# Altium footprint library ALL.PcbLib: 153 footprints (part 4 of 11)
Each footprint in its own frame and in the unit in brackets; x right, y up, seen from the top. Pads: shape width x height; smd on the part's side, far side on the other; paste and mask are expansions set on the pad; w line width, h text height; cw(c..) or ccw(c..) is an arc to the next point about the centre after c.
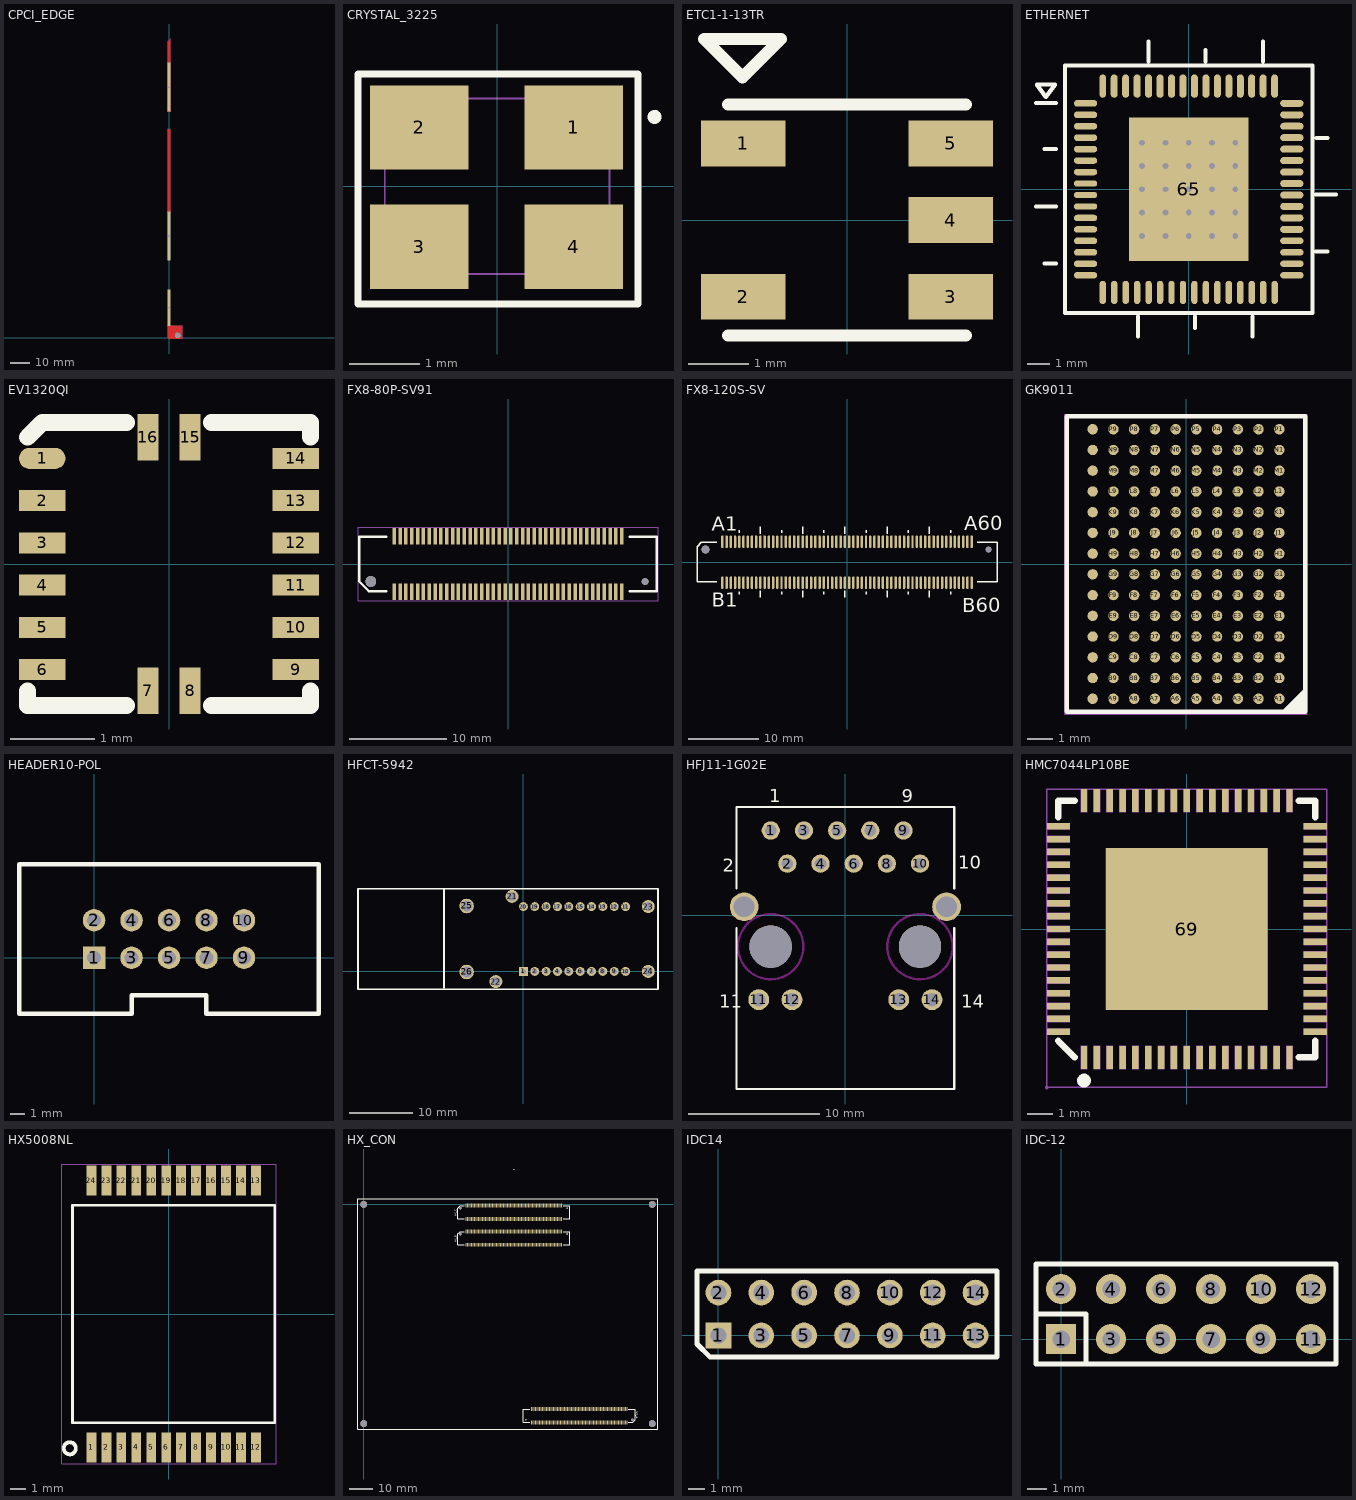
[diagram p3: the footprints below, top view; thin cyan lines are the x and y axes]

## CPCI_EDGE [mil]
pads (4):
  rect 60x1000 / inner round 60 / far side rect 60x1000 hole 35: 1(-10,5100) 2(-10,2070)
  rect 60x740 / inner round 60 / far side rect 60x740 hole 35: 3(-10,610)
  round 100 hole 106: 4(170,50)
Top Layer:
  region: -40,250 -40,10 -5,-25 260,-25 260,240 20,240 20,250
  region: -40,2540 -40,4240 20,4240 20,2540
  region: -40,6020 20,6080 20,4600 -40,4600
  region: -40,5560 -40,6020 20,6020 20,5560
Bottom Layer:
  region: -40,261 -40,11 -5,-24 260,-24 260,241 20,241 20,261
  region: -40,1590 -40,4250 20,4250 20,1590
  region: -40,6020 20,6080 20,4600 -40,4600
  region: -40,6020 -40,4600 20,4600 20,6020

## CRYSTAL_3225 [mil] "CRYSTAL_3225"
pads (4):
  rect 55.12x47.24 smd: 1(43,33.01) 2(-43.62,33.01) 3(-43.62,-33.92) 4(43,-33.92)
Top Overlay:
  circle w3.94: c88.27,38.91 r1.97
  lines w3.94: -78,-65.99 79,-65.99 79,63.01 -78,63.01 -78,-65.99
  text ".Designator" at -69.88,111.01 h30
Mechanical 7:
  lines w1: -63,-49.21 62.99,-49.21 62.99,49.21 -63,49.21 -63,-49.21

## ETC1-1-13TR [mm]
pads (5):
  rect 1.4x0.76 smd: 1(-1.715,1.27) 2(-1.715,-1.27) 3(1.715,-1.27) 4(1.715,0) 5(1.715,1.27)
Top Overlay:
  lines w0.2: -1.97,-1.915 1.97,-1.915 ; -1.97,1.915 1.97,1.915 ; -2.365,3 -1.095,3 -1.73,2.365 -2.365,3

## ETHERNET [mm]
height 1.1
pads (65):
  oval 1.016x0.279 smd: 1(-4.5,3.75) 2(-4.5,3.25) 3(-4.5,2.75) 4(-4.5,2.25) 5(-4.5,1.75) 6(-4.5,1.25) 7(-4.5,0.75) 8(-4.5,0.25) 9(-4.5,-0.25) 10(-4.5,-0.75) 11(-4.5,-1.25) 12(-4.5,-1.75) 13(-4.5,-2.25) 14(-4.5,-2.75) 15(-4.5,-3.25) 16(-4.5,-3.75) 33(4.5,-3.75) 34(4.5,-3.25) 35(4.5,-2.75) 36(4.5,-2.25)
  oval 0.279x1.016 smd: 17(-3.75,-4.5) 18(-3.25,-4.5) 19(-2.75,-4.5) 20(-2.25,-4.5) 21(-1.75,-4.5) 22(-1.25,-4.5) 23(-0.75,-4.5) 24(-0.25,-4.5) 25(0.25,-4.5) 26(0.75,-4.5) 27(1.25,-4.5) 28(1.75,-4.5) 29(2.25,-4.5) 30(2.75,-4.5) 31(3.25,-4.5) 32(3.75,-4.5) 64(-3.75,4.5)
  oval 1.016x0.305 smd: 37(4.5,-1.75) 38(4.5,-1.25) 39(4.5,-0.75) 40(4.5,-0.25) 41(4.5,0.25) 42(4.5,0.75) 43(4.5,1.25) 44(4.5,1.75) 45(4.5,2.25) 46(4.5,2.75) 47(4.5,3.25) 48(4.5,3.75)
  oval 0.305x1.016 smd: 49(3.75,4.5) 50(3.25,4.5) 51(2.75,4.5) 52(2.25,4.5) 53(1.75,4.5) 54(1.25,4.5) 55(0.75,4.5) 56(0.25,4.5) 57(-0.25,4.5) 58(-0.75,4.5) 59(-1.25,4.5) 60(-1.75,4.5) 61(-2.25,4.5) 62(-2.75,4.5) 63(-3.25,4.5)
  rect 5.21x6.25 smd: 65(0,0)
via 0,0 diameter 0.457 hole 0.254
via 0,1.016 diameter 0.457 hole 0.254
via 0,2.032 diameter 0.457 hole 0.254
via 0,-1.016 diameter 0.457 hole 0.254
via 0,-2.032 diameter 0.457 hole 0.254
via -1.016,0 diameter 0.457 hole 0.254
via -2.032,0 diameter 0.457 hole 0.254
via 1.016,0 diameter 0.457 hole 0.254
via 2.032,0 diameter 0.457 hole 0.254
via 1.016,1.016 diameter 0.457 hole 0.254
via 1.016,2.032 diameter 0.457 hole 0.254
via 1.016,-1.016 diameter 0.457 hole 0.254
via 1.016,-2.032 diameter 0.457 hole 0.254
via 2.032,1.016 diameter 0.457 hole 0.254
via 2.032,2.032 diameter 0.457 hole 0.254
via 2.032,-1.016 diameter 0.457 hole 0.254
via 2.032,-2.032 diameter 0.457 hole 0.254
via -1.016,1.016 diameter 0.457 hole 0.254
via -1.016,2.032 diameter 0.457 hole 0.254
via -1.016,-1.016 diameter 0.457 hole 0.254
via -1.016,-2.032 diameter 0.457 hole 0.254
via -2.032,1.016 diameter 0.457 hole 0.254
via -2.032,2.032 diameter 0.457 hole 0.254
via -2.032,-1.016 diameter 0.457 hole 0.254
via -2.032,-2.032 diameter 0.457 hole 0.254
Top Overlay:
  lines w0.178: -6.662,-0.743 -5.798,-0.743 ; -6.662,3.757 -5.798,3.757 ; -6.292,-3.243 -5.798,-3.243 ; -6.292,1.757 -5.798,1.757 ; -2.217,-6.414 -2.217,-5.551 ; -1.76,5.575 -1.76,6.438 ; 0.283,-6.044 0.283,-5.551 ; 0.74,5.575 0.74,6.068 ; 2.783,-6.414 2.783,-5.551 ; 3.24,5.575 3.24,6.438 ; 5.563,-2.718 6.056,-2.718 ; 5.563,-0.229 6.426,-0.229 ; 5.566,2.243 6.06,2.243 ; -6.625,4.571 -5.825,4.571 -6.233,4.025 -6.625,4.571 ; -5.4,-5.4 -5.4,5.4 5.4,5.4 5.4,-5.4 -5.4,-5.4

## EV1320QI [mm]
pads (16):
  oval 0.55x0.25 smd: 1(-1.5,1.25)
  rect 0.55x0.25 smd: 2(-1.5,0.75) 3(-1.5,0.25) 4(-1.5,-0.25) 5(-1.5,-0.75) 6(-1.5,-1.25) 9(1.5,-1.25) 10(1.5,-0.75) 11(1.5,-0.25) 12(1.5,0.25) 13(1.5,0.75) 14(1.5,1.25)
  rect 0.25x0.55 smd: 7(-0.25,-1.5) 8(0.25,-1.5) 15(0.25,1.5) 16(-0.25,1.5)
Top Overlay:
  lines w0.2: -1.675,-1.5 -1.675,-1.675 -0.5,-1.675 ; -1.675,1.5 -1.5,1.675 -0.5,1.675 ; 0.5,-1.675 1.675,-1.675 1.675,-1.5 ; 0.5,1.675 1.675,1.675 1.675,1.5

## FX8-80P-SV91 [mm] "FX8-80P-SV91"
pads (82):
  rect 0.35x1.7 smd: A1_1(-11.7,-2.85) A1_2(-11.1,-2.85) A1_3(-10.5,-2.85) A1_4(-9.9,-2.85) A1_5(-9.3,-2.85) A1_6(-8.7,-2.85) A1_7(-8.1,-2.85) A1_8(-7.5,-2.85) A1_9(-6.9,-2.85) A1_10(-6.3,-2.85) A1_11(-5.7,-2.85) A1_12(-5.1,-2.85) A1_13(-4.5,-2.85) A1_14(-3.9,-2.85) A1_15(-3.3,-2.85) A1_16(-2.7,-2.85) A1_17(-2.1,-2.85) A1_18(-1.5,-2.85) A1_19(-0.9,-2.85) A1_20(-0.3,-2.85) A1_21(0.3,-2.85) A1_22(0.9,-2.85) A1_23(1.5,-2.85) A1_24(2.1,-2.85) A1_25(2.7,-2.85) A1_26(3.3,-2.85) A1_27(3.9,-2.85) A1_28(4.5,-2.85) A1_29(5.1,-2.85) A1_30(5.7,-2.85) A1_31(6.3,-2.85) A1_32(6.9,-2.85) A1_33(7.5,-2.85) A1_34(8.1,-2.85) A1_35(8.7,-2.85) A1_36(9.3,-2.85) A1_37(9.9,-2.85) A1_38(10.5,-2.85) A1_39(11.1,-2.85) A1_40(11.7,-2.85) B1_1(-11.7,2.85) B1_2(-11.1,2.85) B1_3(-10.5,2.85) B1_4(-9.9,2.85) B1_5(-9.3,2.85) B1_6(-8.7,2.85) B1_7(-8.1,2.85) B1_8(-7.5,2.85) B1_9(-6.9,2.85) B1_10(-6.3,2.85) B1_11(-5.7,2.85) B1_12(-5.1,2.85) B1_13(-4.5,2.85) B1_14(-3.9,2.85) B1_15(-3.3,2.85) B1_16(-2.7,2.85) B1_17(-2.1,2.85) B1_18(-1.5,2.85) B1_19(-0.9,2.85) B1_20(-0.3,2.85) B1_21(0.3,2.85) B1_22(0.9,2.85) B1_23(1.5,2.85) B1_24(2.1,2.85) B1_25(2.7,2.85) B1_26(3.3,2.85) B1_27(3.9,2.85) B1_28(4.5,2.85) B1_29(5.1,2.85) B1_30(5.7,2.85) B1_31(6.3,2.85) B1_32(6.9,2.85) B1_33(7.5,2.85) B1_34(8.1,2.85) B1_35(8.7,2.85) B1_36(9.3,2.85) B1_37(9.9,2.85) B1_38(10.5,2.85) B1_39(11.1,2.85) B1_40(11.7,2.85)
  round 1.1 hole 1.1: ZH-C1(-14.1,-1.8)
  round 0.7 hole 0.7: ZH-C2(14.1,-1.8)
Top Overlay:
  lines w0.254: -12.5,-2.8 -14.3,-2.8 -15.3,-1.8 -15.3,2.8 -12.5,2.8 ; 12.5,-2.8 15.3,-2.8 15.3,2.8 12.5,2.8
  text ".Designator" at -0.709,-5.085 h0.76
Mechanical 7:
  lines w0.025: -15.427,-3.802 15.427,-3.802 15.427,3.802 -15.427,3.802 -15.427,-3.802

## FX8-120S-SV [mm]
pads (122):
  oval 0.35x1.8 smd mask+0.102: A1(-17.7,2.9) A2(-17.1,2.9) A3(-16.5,2.9) A4(-15.9,2.9) A5(-15.3,2.9) A6(-14.7,2.9) A7(-14.1,2.9) A8(-13.5,2.9) A9(-12.9,2.9) A10(-12.3,2.9) A11(-11.7,2.9) A12(-11.1,2.9) A13(-10.5,2.9) A14(-9.9,2.9) A15(-9.3,2.9) A16(-8.7,2.9) A17(-8.1,2.9) A18(-7.5,2.9) A19(-6.9,2.9) A20(-6.3,2.9) A21(-5.7,2.9) A22(-5.1,2.9) A23(-4.5,2.9) A24(-3.9,2.9) A25(-3.3,2.9) A26(-2.7,2.9) A27(-2.1,2.9) A28(-1.5,2.9) A29(-0.9,2.9) A30(-0.3,2.9) A31(0.3,2.9) A32(0.9,2.9) A33(1.5,2.9) A34(2.1,2.9) A35(2.7,2.9) A36(3.3,2.9) A37(3.9,2.9) A38(4.5,2.9) A39(5.1,2.9) A40(5.7,2.9) A41(6.3,2.9) A42(6.9,2.9) A43(7.5,2.9) A44(8.1,2.9) A45(8.7,2.9) A46(9.3,2.9) A47(9.9,2.9) A48(10.5,2.9) A49(11.1,2.9) A50(11.7,2.9) A51(12.3,2.9) A52(12.9,2.9) A53(13.5,2.9) A54(14.1,2.9) A55(14.7,2.9) A56(15.3,2.9) A57(15.9,2.9) A58(16.5,2.9) A59(17.1,2.9) A60(17.7,2.9) B1(-17.7,-2.9) B2(-17.1,-2.9) B3(-16.5,-2.9) B4(-15.9,-2.9) B5(-15.3,-2.9) B6(-14.7,-2.9) B7(-14.1,-2.9) B8(-13.5,-2.9) B9(-12.9,-2.9) B10(-12.3,-2.9) B11(-11.7,-2.9) B12(-11.1,-2.9) B13(-10.5,-2.9) B14(-9.9,-2.9) B15(-9.3,-2.9) B16(-8.7,-2.9) B17(-8.1,-2.9) B18(-7.5,-2.9) B19(-6.9,-2.9) B20(-6.3,-2.9) B21(-5.7,-2.9) B22(-5.1,-2.9) B23(-4.5,-2.9) B24(-3.9,-2.9) B25(-3.3,-2.9) B26(-2.7,-2.9) B27(-2.1,-2.9) B28(-1.5,-2.9) B29(-0.9,-2.9) B30(-0.3,-2.9) B31(0.3,-2.9) B32(0.9,-2.9) B33(1.5,-2.9) B34(2.1,-2.9) B35(2.7,-2.9) B36(3.3,-2.9) B37(3.9,-2.9) B38(4.5,-2.9) B39(5.1,-2.9) B40(5.7,-2.9) B41(6.3,-2.9) B42(6.9,-2.9) B43(7.5,-2.9) B44(8.1,-2.9) B45(8.7,-2.9) B46(9.3,-2.9) B47(9.9,-2.9) B48(10.5,-2.9) B49(11.1,-2.9) B50(11.7,-2.9) B51(12.3,-2.9) B52(12.9,-2.9) B53(13.5,-2.9) B54(14.1,-2.9) B55(14.7,-2.9) B56(15.3,-2.9) B57(15.9,-2.9) B58(16.5,-2.9) B59(17.1,-2.9) B60(17.7,-2.9)
  round 1.1 hole 1.1 unplated mask+0.102: ""(-20.1,1.8)
  round 0.8 hole 0.8 unplated mask+0.102: ""(20.1,1.8)
Top Overlay:
  lines w0.178: -18.5,-2.8 -21.3,-2.8 -21.3,2.195 -20.695,2.8 -18.5,2.8 ; -15.291,-4.547 -15.291,-4.166 ; -15.291,4.166 -15.291,4.547 ; -12.319,-5.004 -12.319,-4.064 ; -12.319,4.064 -12.319,5.004 ; -9.291,-4.547 -9.291,-4.166 ; -9.291,4.166 -9.291,4.547 ; -6.319,-5.004 -6.319,-4.064 ; -6.319,4.064 -6.319,5.004 ; -3.291,-4.547 -3.291,-4.166 ; -3.291,4.166 -3.291,4.547 ; -0.319,-5.004 -0.319,-4.064 ; -0.319,4.064 -0.319,5.004 ; 2.709,-4.547 2.709,-4.166 ; 2.709,4.166 2.709,4.547 ; 5.681,-5.004 5.681,-4.064 ; 5.681,4.064 5.681,5.004 ; 8.709,-4.547 8.709,-4.166 ; 8.709,4.166 8.709,4.547 ; 11.681,-5.004 11.681,-4.064 ; 11.681,4.064 11.681,5.004 ; 14.709,-4.547 14.709,-4.166 ; 14.709,4.166 14.709,4.547 ; 18.5,-2.8 21.3,-2.8 21.3,2.8 18.5,2.8
  text "A1" at -19.177,4.445 h2.03
  text "B1" at -19.177,-6.35 h2.03
  text "A60" at 16.637,4.572 h2.03
  text "B60" at 16.383,-7.112 h2.03

## GK9011 [mm] "GK9011"
pads (140):
  round 0.4 smd: A1(3.6,-5.2) A2(2.8,-5.2) A3(2,-5.2) A4(1.2,-5.2) A5(0.4,-5.2) A6(-0.4,-5.2) A7(-1.2,-5.2) A8(-2,-5.2) A9(-2.8,-5.2) A10(-3.6,-5.2) B1(3.6,-4.4) B2(2.8,-4.4) B3(2,-4.4) B4(1.2,-4.4) B5(0.4,-4.4) B6(-0.4,-4.4) B7(-1.2,-4.4) B8(-2,-4.4) B9(-2.8,-4.4) B10(-3.6,-4.4) C1(3.6,-3.6) C2(2.8,-3.6) C3(2,-3.6) C4(1.2,-3.6) C5(0.4,-3.6) C6(-0.4,-3.6) C7(-1.2,-3.6) C8(-2,-3.6) C9(-2.8,-3.6) C10(-3.6,-3.6) D1(3.6,-2.8) D2(2.8,-2.8) D3(2,-2.8) D4(1.2,-2.8) D5(0.4,-2.8) D6(-0.4,-2.8) D7(-1.2,-2.8) D8(-2,-2.8) D9(-2.8,-2.8) D10(-3.6,-2.8) E1(3.6,-2) E2(2.8,-2) E3(2,-2) E4(1.2,-2) E5(0.4,-2) E6(-0.4,-2) E7(-1.2,-2) E8(-2,-2) E9(-2.8,-2) E10(-3.6,-2) F1(3.6,-1.2) F2(2.8,-1.2) F3(2,-1.2) F4(1.2,-1.2) F5(0.4,-1.2) F6(-0.4,-1.2) F7(-1.2,-1.2) F8(-2,-1.2) F9(-2.8,-1.2) F10(-3.6,-1.2) G1(3.6,-0.4) G2(2.8,-0.4) G3(2,-0.4) G4(1.2,-0.4) G5(0.4,-0.4) G6(-0.4,-0.4) G7(-1.2,-0.4) G8(-2,-0.4) G9(-2.8,-0.4) G10(-3.6,-0.4) H1(3.6,0.4) H2(2.8,0.4) H3(2,0.4) H4(1.2,0.4) H5(0.4,0.4) H6(-0.4,0.4) H7(-1.2,0.4) H8(-2,0.4) H9(-2.8,0.4) H10(-3.6,0.4) J1(3.6,1.2) J2(2.8,1.2) J3(2,1.2) J4(1.2,1.2) J5(0.4,1.2) J6(-0.4,1.2) J7(-1.2,1.2) J8(-2,1.2) J9(-2.8,1.2) J10(-3.6,1.2) K1(3.6,2) K2(2.8,2) K3(2,2) K4(1.2,2) K5(0.4,2) K6(-0.4,2) K7(-1.2,2) K8(-2,2) K9(-2.8,2) K10(-3.6,2) L1(3.6,2.8) L2(2.8,2.8) L3(2,2.8) L4(1.2,2.8) L5(0.4,2.8) L6(-0.4,2.8) L7(-1.2,2.8) L8(-2,2.8) L9(-2.8,2.8) L10(-3.6,2.8) M1(3.6,3.6) M2(2.8,3.6) M3(2,3.6) M4(1.2,3.6) M5(0.4,3.6) M6(-0.4,3.6) M7(-1.2,3.6) M8(-2,3.6) M9(-2.8,3.6) M10(-3.6,3.6) N1(3.6,4.4) N2(2.8,4.4) N3(2,4.4) N4(1.2,4.4) N5(0.4,4.4) N6(-0.4,4.4) N7(-1.2,4.4) N8(-2,4.4) N9(-2.8,4.4) N10(-3.6,4.4) P1(3.6,5.2) P2(2.8,5.2) P3(2,5.2) P4(1.2,5.2) P5(0.4,5.2) P6(-0.4,5.2) P7(-1.2,5.2) P8(-2,5.2) P9(-2.8,5.2) P10(-3.6,5.2)
Top Overlay:
  dashed: 3.682,-5.7 4.6,-4.782 4.6,-5.7
  lines w0.178: -4.6,-5.7 4.6,-5.7 4.6,5.7 -4.6,5.7 -4.6,-5.7
Mechanical 7:
  lines w0.025: -4.689,-5.789 4.689,-5.789 4.689,5.789 -4.689,5.789 -4.689,-5.789
Mechanical 16:
  text ".Designator" at 0,0 h0.76

## HEADER10-POL [mil]
pads (10):
  rect 60x60 hole 37: 1(0,0)
  round 60 hole 37: 2(0,100) 3(100,0) 4(100,100) 5(200,0) 6(200,100) 7(300,0) 8(300,100) 9(400,0) 10(400,100)
Top Overlay:
  lines w12: -200,-150 -200,250 600,250 600,-150 300,-150 300,-100 100,-100 100,-150 -200,-150

## HFCT-5942 [mil]
pads (26):
  rect 55x55 / inner round 55 / far side rect 55x55 hole 32: 1(0,0)
  round 55 hole 32: 2(70,0) 3(140,0) 4(210,0) 5(280,0) 6(350,0) 7(420,0) 8(490,0) 9(560,0) 10(630,0) 11(630,400) 12(560,400) 13(490,400) 14(420,400) 15(350,400) 16(280,400) 17(210,400) 18(140,400) 19(70,400) 20(0,400)
  round 80 hole 55: 21(-70,462.5) 22(-170,-62.5) 23(770,400) 24(770,0)
  round 90 hole 70: 25(-350,403.5) 26(-350,-3.5)
Top Overlay:
  lines w10: -490,-100 -490,510 ; -1020,-110 830,-110 830,510 -1020,510 -1020,-110

## HFJ11-1G02E [mm]
pads (18):
  round 1.4 hole 0.89: 1(-5.71,6.475) 2(-4.44,3.935) 3(-3.17,6.475) 4(-1.9,3.935) 5(-0.63,6.475) 6(0.64,3.935) 7(1.91,6.475) 8(3.18,3.935) 9(4.45,6.475) 10(5.72,3.935)
  round 1.6 hole 1.02: 11(-6.63,-6.475) 12(-4.09,-6.475) 13(4.09,-6.475) 14(6.63,-6.475)
  round 2.2 hole 1.6: ""(-7.745,0.635) ""(7.745,0.635)
  round 3.25 hole 3.25 unplated: ""(-5.715,-2.415) ""(5.715,-2.415)
Top Overlay:
  lines w0.178: -8.33,-1.016 -8.33,-13.315 8.33,-13.315 8.33,-1.016 ; -8.33,2.032 -8.33,8.275 8.33,8.275 8.33,2.032
  text "11" at -9.652,-7.112 h1.02
  text "14" at 8.89,-7.112 h1.02
  text "2" at -9.398,3.302 h1.02
  text "10" at 8.636,3.556 h1.02
  text "9" at 4.318,8.636 h1.02
  text "1" at -5.842,8.636 h1.02
Keep-Out Layer:
  circle w0.178: c5.715,-2.415 r2.5
  circle w0.178: c-5.715,-2.415 r2.5

## HMC7044LP10BE [mm]
pads (69):
  rect 0.25x0.9 smd mask+0.051: 1(-4,-5) 2(-3.5,-5) 3(-3,-5) 4(-2.5,-5) 5(-2,-5) 6(-1.5,-5) 7(-1,-5) 8(-0.5,-5) 9(0,-5) 10(0.5,-5) 11(1,-5) 12(1.5,-5) 13(2,-5) 14(2.5,-5) 15(3,-5) 16(3.5,-5) 17(4,-5) 35(4,5) 36(3.5,5) 37(3,5) 38(2.5,5) 39(2,5) 40(1.5,5) 41(1,5) 42(0.5,5) 43(0,5) 44(-0.5,5) 45(-1,5) 46(-1.5,5) 47(-2,5) 48(-2.5,5) 49(-3,5) 50(-3.5,5) 51(-4,5)
  rect 0.9x0.25 smd mask+0.051: 18(5,-4) 19(5,-3.5) 20(5,-3) 21(5,-2.5) 22(5,-2) 23(5,-1.5) 24(5,-1) 25(5,-0.5) 26(5,0) 27(5,0.5) 28(5,1) 29(5,1.5) 30(5,2) 31(5,2.5) 32(5,3) 33(5,3.5) 34(5,4) 52(-5,4) 53(-5,3.5) 54(-5,3) 55(-5,2.5) 56(-5,2) 57(-5,1.5) 58(-5,1) 59(-5,0.5) 60(-5,0) 61(-5,-0.5) 62(-5,-1) 63(-5,-1.5) 64(-5,-2) 65(-5,-2.5) 66(-5,-3) 67(-5,-3.5) 68(-5,-4)
  rect 6.3x6.3 smd mask+0.051: 69(0,0)
Top Overlay:
  circle w0.254: c-4,-5.9 r0.141
  lines w0.254: -5,-4.356 -4.356,-5 ; -5,4.356 -5,5 -4.356,5 ; 4.356,-5 5,-5 5,-4.356 ; 4.356,5 5,5 5,4.356
Mechanical 15:
  drawing of 74 lines, arcs and shapes, not listed

## HX5008NL [mm] "HX5008NL"
pads (24):
  rect 0.65x2 smd: 1(-5.136,-8.828) 2(-4.146,-8.828) 3(-3.156,-8.828) 4(-2.166,-8.828) 5(-1.176,-8.828) 6(-0.186,-8.828) 7(0.804,-8.828) 8(1.794,-8.828) 9(2.784,-8.828) 10(3.774,-8.828) 11(4.764,-8.828) 12(5.754,-8.828) 13(5.754,8.828) 14(4.764,8.828) 15(3.774,8.828) 16(2.784,8.828) 17(1.794,8.828) 18(0.804,8.828) 19(-0.186,8.828) 20(-1.176,8.828) 21(-2.166,8.828) 22(-3.156,8.828) 23(-4.146,8.828) 24(-5.136,8.828)
Top Overlay:
  circle w0.254: c-6.569,-8.89 r0.402
  lines w0.178: -6.391,-7.192 7.009,-7.192 7.009,7.192 -6.391,7.192 -6.391,-7.192
  text ".Designator" at -5.133,-10.965 h0.76
Mechanical 7:
  lines w0.025: -7.098,-9.929 7.098,-9.929 7.098,9.929 -7.098,9.929 -7.098,-9.929

## HX_CON [mm]
pads (430):
  round 3 hole 3 unplated: 0(0,-95) 0(0,0) 0(125,-95) 0(125,0)
  rect 0.35x1.7 smd mask+0.102: A1_1(44.306,-0.55) A1_2(44.906,-0.55) A1_3(45.506,-0.55) A1_4(46.106,-0.55) A1_5(46.706,-0.55) A1_6(47.306,-0.55) A1_7(47.906,-0.55) A1_8(48.506,-0.55) A1_9(49.106,-0.55) A1_10(49.706,-0.55) A1_11(50.306,-0.55) A1_12(50.906,-0.55) A1_13(51.506,-0.55) A1_14(52.106,-0.55) A1_15(52.706,-0.55) A1_16(53.306,-0.55) A1_17(53.906,-0.55) A1_18(54.506,-0.55) A1_19(55.106,-0.55) A1_20(55.706,-0.55) A1_21(56.306,-0.55) A1_22(56.906,-0.55) A1_23(57.506,-0.55) A1_24(58.106,-0.55) A1_25(58.706,-0.55) A1_26(59.306,-0.55) A1_27(59.906,-0.55) A1_28(60.506,-0.55) A1_29(61.106,-0.55) A1_30(61.706,-0.55) A1_31(62.306,-0.55) A1_32(62.906,-0.55) A1_33(63.506,-0.55) A1_34(64.106,-0.55) A1_35(64.706,-0.55) A1_36(65.306,-0.55) A1_37(65.906,-0.55) A1_38(66.506,-0.55) A1_39(67.106,-0.55) A1_40(67.706,-0.55) A1_41(68.306,-0.55) A1_42(68.906,-0.55) A1_43(69.506,-0.55) A1_44(70.106,-0.55) A1_45(70.706,-0.55) A1_46(71.306,-0.55) A1_47(71.906,-0.55) A1_48(72.506,-0.55) A1_49(73.106,-0.55) A1_50(73.706,-0.55) A1_51(74.306,-0.55) A1_52(74.906,-0.55) A1_53(75.506,-0.55) A1_54(76.106,-0.55) A1_55(76.706,-0.55) A1_56(77.306,-0.55) A1_57(77.906,-0.55) A1_58(78.506,-0.55) A1_59(79.106,-0.55) A1_60(79.706,-0.55) A1_61(80.306,-0.55) A1_62(80.906,-0.55) A1_63(81.506,-0.55) A1_64(82.106,-0.55) A1_65(82.706,-0.55) A1_66(83.306,-0.55) A1_67(83.906,-0.55) A1_68(84.506,-0.55) A1_69(85.106,-0.55) A1_70(85.706,-0.55) A2_1(44.306,-11.779) A2_2(44.906,-11.779) A2_3(45.506,-11.779) A2_4(46.106,-11.779) A2_5(46.706,-11.779) A2_6(47.306,-11.779) A2_7(47.906,-11.779) A2_8(48.506,-11.779) A2_9(49.106,-11.779) A2_10(49.706,-11.779) A2_11(50.306,-11.779) A2_12(50.906,-11.779) A2_13(51.506,-11.779) A2_14(52.106,-11.779) A2_15(52.706,-11.779) A2_16(53.306,-11.779) A2_17(53.906,-11.779) A2_18(54.506,-11.779) A2_19(55.106,-11.779) A2_20(55.706,-11.779) A2_21(56.306,-11.779) A2_22(56.906,-11.779) A2_23(57.506,-11.779) A2_24(58.106,-11.779) A2_25(58.706,-11.779) A2_26(59.306,-11.779) A2_27(59.906,-11.779) A2_28(60.506,-11.779) A2_29(61.106,-11.779) A2_30(61.706,-11.779) A2_31(62.306,-11.779) A2_32(62.906,-11.779) A2_33(63.506,-11.779) A2_34(64.106,-11.779) A2_35(64.706,-11.779) A2_36(65.306,-11.779) A2_37(65.906,-11.779) A2_38(66.506,-11.779) A2_39(67.106,-11.779) A2_40(67.706,-11.779) A2_41(68.306,-11.779) A2_42(68.906,-11.779) A2_43(69.506,-11.779) A2_44(70.106,-11.779) A2_45(70.706,-11.779) A2_46(71.306,-11.779) A2_47(71.906,-11.779) A2_48(72.506,-11.779) A2_49(73.106,-11.779) A2_50(73.706,-11.779) A2_51(74.306,-11.779) A2_52(74.906,-11.779) A2_53(75.506,-11.779) A2_54(76.106,-11.779) A2_55(76.706,-11.779) A2_56(77.306,-11.779) A2_57(77.906,-11.779) A2_58(78.506,-11.779) A2_59(79.106,-11.779) A2_60(79.706,-11.779) A2_61(80.306,-11.779) A2_62(80.906,-11.779) A2_63(81.506,-11.779) A2_64(82.106,-11.779) A2_65(82.706,-11.779) A2_66(83.306,-11.779) A2_67(83.906,-11.779) A2_68(84.506,-11.779) A2_69(85.106,-11.779) A2_70(85.706,-11.779) A3_1(114.01,-94.45) A3_2(113.41,-94.45) A3_3(112.81,-94.45) A3_4(112.21,-94.45) A3_5(111.61,-94.45) A3_6(111.01,-94.45) A3_7(110.41,-94.45) A3_8(109.81,-94.45) A3_9(109.21,-94.45) A3_10(108.61,-94.45) A3_11(108.01,-94.45) A3_12(107.41,-94.45) A3_13(106.81,-94.45) A3_14(106.21,-94.45) A3_15(105.61,-94.45) A3_16(105.01,-94.45) A3_17(104.41,-94.45) A3_18(103.81,-94.45) A3_19(103.21,-94.45) A3_20(102.61,-94.45) A3_21(102.01,-94.45) A3_22(101.41,-94.45) A3_23(100.81,-94.45) A3_24(100.21,-94.45) A3_25(99.61,-94.45) A3_26(99.01,-94.45) A3_27(98.41,-94.45) A3_28(97.81,-94.45) A3_29(97.21,-94.45) A3_30(96.61,-94.45) A3_31(96.01,-94.45) A3_32(95.41,-94.45) A3_33(94.81,-94.45) A3_34(94.21,-94.45) A3_35(93.61,-94.45) A3_36(93.01,-94.45) A3_37(92.41,-94.45) A3_38(91.81,-94.45) A3_39(91.21,-94.45) A3_40(90.61,-94.45) A3_41(90.01,-94.45) A3_42(89.41,-94.45) A3_43(88.81,-94.45) A3_44(88.21,-94.45) A3_45(87.61,-94.45) A3_46(87.01,-94.45) A3_47(86.41,-94.45) A3_48(85.81,-94.45) A3_49(85.21,-94.45) A3_50(84.61,-94.45) A3_51(84.01,-94.45) A3_52(83.41,-94.45) A3_53(82.81,-94.45) A3_54(82.21,-94.45) A3_55(81.61,-94.45) A3_56(81.01,-94.45) A3_57(80.41,-94.45) A3_58(79.81,-94.45) A3_59(79.21,-94.45) A3_60(78.61,-94.45) A3_61(78.01,-94.45) A3_62(77.41,-94.45) A3_63(76.81,-94.45) A3_64(76.21,-94.45) A3_65(75.61,-94.45) A3_66(75.01,-94.45) A3_67(74.41,-94.45) A3_68(73.81,-94.45) A3_69(73.21,-94.45) A3_70(72.61,-94.45) B1_1(44.306,-6.25) B1_2(44.906,-6.25) B1_3(45.506,-6.25) B1_4(46.106,-6.25) B1_5(46.706,-6.25) B1_6(47.306,-6.25) B1_7(47.906,-6.25) B1_8(48.506,-6.25) B1_9(49.106,-6.25) B1_10(49.706,-6.25) B1_11(50.306,-6.25) B1_12(50.906,-6.25) B1_13(51.506,-6.25) B1_14(52.106,-6.25) B1_15(52.706,-6.25) B1_16(53.306,-6.25) B1_17(53.906,-6.25) B1_18(54.506,-6.25) B1_19(55.106,-6.25) B1_20(55.706,-6.25) B1_21(56.306,-6.25) B1_22(56.906,-6.25) B1_23(57.506,-6.25) B1_24(58.106,-6.25) B1_25(58.706,-6.25) B1_26(59.306,-6.25) B1_27(59.906,-6.25) B1_28(60.506,-6.25) B1_29(61.106,-6.25) B1_30(61.706,-6.25) B1_31(62.306,-6.25) B1_32(62.906,-6.25) B1_33(63.506,-6.25) B1_34(64.106,-6.25) B1_35(64.706,-6.25) B1_36(65.306,-6.25) B1_37(65.906,-6.25) B1_38(66.506,-6.25) B1_39(67.106,-6.25) B1_40(67.706,-6.25) B1_41(68.306,-6.25) B1_42(68.906,-6.25) B1_43(69.506,-6.25) B1_44(70.106,-6.25) B1_45(70.706,-6.25) B1_46(71.306,-6.25) B1_47(71.906,-6.25) B1_48(72.506,-6.25) B1_49(73.106,-6.25) B1_50(73.706,-6.25) B1_51(74.306,-6.25) B1_52(74.906,-6.25) B1_53(75.506,-6.25) B1_54(76.106,-6.25) B1_55(76.706,-6.25) B1_56(77.306,-6.25) B1_57(77.906,-6.25) B1_58(78.506,-6.25) B1_59(79.106,-6.25) B1_60(79.706,-6.25) B1_61(80.306,-6.25) B1_62(80.906,-6.25) B1_63(81.506,-6.25) B1_64(82.106,-6.25) B1_65(82.706,-6.25) B1_66(83.306,-6.25) B1_67(83.906,-6.25) B1_68(84.506,-6.25) B1_69(85.106,-6.25) B1_70(85.706,-6.25) B2_1(44.306,-17.479) B2_2(44.906,-17.479) B2_3(45.506,-17.479) B2_4(46.106,-17.479) B2_5(46.706,-17.479) B2_6(47.306,-17.479) B2_7(47.906,-17.479) B2_8(48.506,-17.479) B2_9(49.106,-17.479) B2_10(49.706,-17.479) B2_11(50.306,-17.479) B2_12(50.906,-17.479) B2_13(51.506,-17.479) B2_14(52.106,-17.479) B2_15(52.706,-17.479) B2_16(53.306,-17.479) B2_17(53.906,-17.479) B2_18(54.506,-17.479) B2_19(55.106,-17.479) B2_20(55.706,-17.479) B2_21(56.306,-17.479) B2_22(56.906,-17.479) B2_23(57.506,-17.479) B2_24(58.106,-17.479) B2_25(58.706,-17.479) B2_26(59.306,-17.479) B2_27(59.906,-17.479) B2_28(60.506,-17.479) B2_29(61.106,-17.479) B2_30(61.706,-17.479) B2_31(62.306,-17.479) B2_32(62.906,-17.479) B2_33(63.506,-17.479) B2_34(64.106,-17.479) B2_35(64.706,-17.479) B2_36(65.306,-17.479) B2_37(65.906,-17.479) B2_38(66.506,-17.479) B2_39(67.106,-17.479) B2_40(67.706,-17.479) B2_41(68.306,-17.479) B2_42(68.906,-17.479) B2_43(69.506,-17.479) B2_44(70.106,-17.479) B2_45(70.706,-17.479) B2_46(71.306,-17.479) B2_47(71.906,-17.479) B2_48(72.506,-17.479) B2_49(73.106,-17.479) B2_50(73.706,-17.479) B2_51(74.306,-17.479) B2_52(74.906,-17.479) B2_53(75.506,-17.479) B2_54(76.106,-17.479) B2_55(76.706,-17.479) B2_56(77.306,-17.479) B2_57(77.906,-17.479) B2_58(78.506,-17.479) B2_59(79.106,-17.479) B2_60(79.706,-17.479) B2_61(80.306,-17.479) B2_62(80.906,-17.479) B2_63(81.506,-17.479) B2_64(82.106,-17.479) B2_65(82.706,-17.479) B2_66(83.306,-17.479) B2_67(83.906,-17.479) B2_68(84.506,-17.479) B2_69(85.106,-17.479) B2_70(85.706,-17.479) B3_1(114.01,-88.75) B3_2(113.41,-88.75) B3_3(112.81,-88.75) B3_4(112.21,-88.75) B3_5(111.61,-88.75) B3_6(111.01,-88.75) B3_7(110.41,-88.75) B3_8(109.81,-88.75) B3_9(109.21,-88.75) B3_10(108.61,-88.75) B3_11(108.01,-88.75) B3_12(107.41,-88.75) B3_13(106.81,-88.75) B3_14(106.21,-88.75) B3_15(105.61,-88.75) B3_16(105.01,-88.75) B3_17(104.41,-88.75) B3_18(103.81,-88.75) B3_19(103.21,-88.75) B3_20(102.61,-88.75) B3_21(102.01,-88.75) B3_22(101.41,-88.75) B3_23(100.81,-88.75) B3_24(100.21,-88.75) B3_25(99.61,-88.75) B3_26(99.01,-88.75) B3_27(98.41,-88.75) B3_28(97.81,-88.75) B3_29(97.21,-88.75) B3_30(96.61,-88.75) B3_31(96.01,-88.75) B3_32(95.41,-88.75) B3_33(94.81,-88.75) B3_34(94.21,-88.75) B3_35(93.61,-88.75) B3_36(93.01,-88.75) B3_37(92.41,-88.75) B3_38(91.81,-88.75) B3_39(91.21,-88.75) B3_40(90.61,-88.75) B3_41(90.01,-88.75) B3_42(89.41,-88.75) B3_43(88.81,-88.75) B3_44(88.21,-88.75) B3_45(87.61,-88.75) B3_46(87.01,-88.75) B3_47(86.41,-88.75) B3_48(85.81,-88.75) B3_49(85.21,-88.75) B3_50(84.61,-88.75) B3_51(84.01,-88.75) B3_52(83.41,-88.75) B3_53(82.81,-88.75) B3_54(82.21,-88.75) B3_55(81.61,-88.75) B3_56(81.01,-88.75) B3_57(80.41,-88.75) B3_58(79.81,-88.75) B3_59(79.21,-88.75) B3_60(78.61,-88.75) B3_61(78.01,-88.75) B3_62(77.41,-88.75) B3_63(76.81,-88.75) B3_64(76.21,-88.75) B3_65(75.61,-88.75) B3_66(75.01,-88.75) B3_67(74.41,-88.75) B3_68(73.81,-88.75) B3_69(73.21,-88.75) B3_70(72.61,-88.75)
  round 1.1 hole 1.1 unplated: ""(41.906,-12.829) ""(41.906,-1.6) ""(116.41,-93.4)
  round 0.7 hole 0.7 unplated: ""(70.21,-93.4) ""(88.106,-12.829) ""(88.106,-1.6)
via 65.006,15.12 diameter 0.457 hole 0.254
Top Overlay:
  lines w0.178: 43.606,-17.429 40.706,-17.429 40.706,-12.829 41.706,-11.829 43.606,-11.829 ; 43.606,-6.2 40.706,-6.2 40.706,-1.6 41.706,-0.6 43.606,-0.6 ; 71.91,-94.4 69.01,-94.4 69.01,-88.8 71.91,-88.8 ; 86.406,-17.429 89.306,-17.429 89.306,-11.829 86.406,-11.829 ; 86.406,-6.2 89.306,-6.2 89.306,-0.6 86.406,-0.6 ; 114.71,-94.4 116.61,-94.4 117.61,-93.4 117.61,-88.8 114.71,-88.8 ; -2.5,-97.5 127.5,-97.5 127.5,2.5 -2.5,2.5 -2.5,-97.5
  text "HX_A" at 117.928,-89.804 h0.76
  text "HX_B" at 40.425,-16.419 h0.76
  text "HX_C" at 40.425,-5.19 h0.76

## IDC14 [mil]
pads (14):
  rect 60x60 hole 37: 1(0,0)
  round 60 hole 37: 2(0,100) 3(100,0) 4(100,100) 5(200,0) 6(200,100) 7(300,0) 8(300,100) 9(400,0) 10(400,100) 11(500,0) 12(500,100) 13(600,0) 14(600,100)
Top Overlay:
  lines w12: -50,-20 -50,150 650,150 650,-50 -20,-50 -50,-20

## IDC-12 [mil]
pads (12):
  rect 60x60 / inner round 60 / far side rect 60x60 hole 35: 1(0,0)
  round 60 hole 35: 2(0,100) 3(100,0) 4(100,100) 5(200,0) 6(200,100) 7(300,0) 8(300,100) 9(400,0) 10(400,100) 11(500,0) 12(500,100)
Top Overlay:
  lines w10: -50,50 50,50 50,-50 ; -50,-50 550,-50 550,150 -50,150 -50,-50